# Altium footprint library 20210518.PcbLib: 414 footprints (part 14 of 26)
Each footprint in its own frame and in the unit in brackets; x right, y up, seen from the top. Pads: shape width x height; smd on the part's side, far side on the other; paste and mask are expansions set on the pad; w line width, h text height; cw(c..) or ccw(c..) is an arc to the next point about the centre after c.
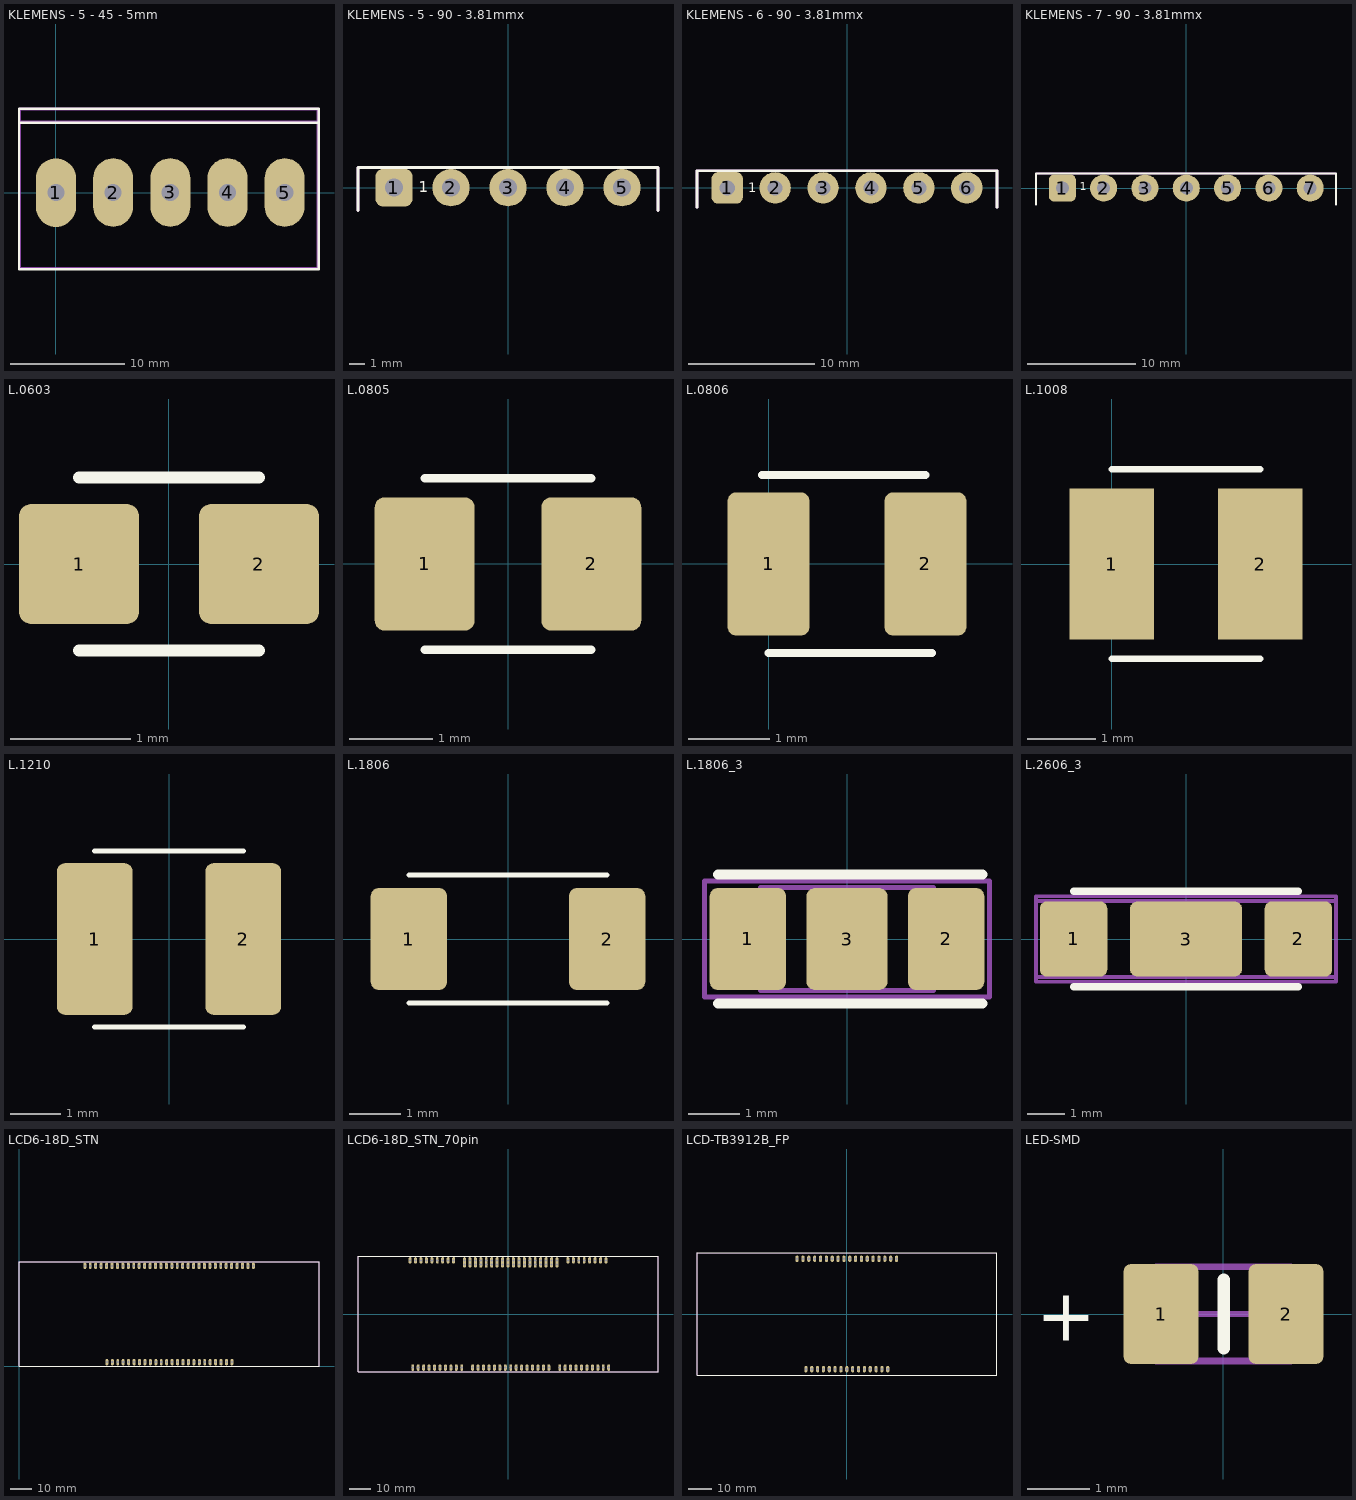
[diagram p13: the footprints below, top view; thin cyan lines are the x and y axes]

## KLEMENS - 5 - 45 - 5mm [mm] "45 Derece 5 Pin Yesil Konnektor"
pads (5):
  oval 3.5x5.999 hole 1.499: 1(0,0) 2(5,0.012) 3(10,0.015) 4(15,0.015) 5(20,0.012)
Top Overlay:
  lines w0.203: -3.231,-6.692 -3.231,7.329 22.978,7.329 22.978,-6.692 -3.231,-6.692
  lines w0.254: -3.069,6.11 22.966,6.11
Mechanical 13:
  lines w0.254: -3.196,7.303 -3.196,-6.641 22.9,-6.641 22.9,7.303 -3.17,7.303 ; -3.17,6.16 22.788,6.16
3D body: height 15.3, standoff -3.5, extent -3.27,-6.4 22.471,7

## KLEMENS - 5 - 90 - 3.81mmx [mm] "Connector; Header; 5 Position"
height 8.5
pads (5):
  rrect40% 2.5x2.5 hole 1.2: 1(-7.62,0)
  round 2.5 hole 1.2: 2(-3.81,0) 3(0,0) 4(3.81,0) 5(7.62,0)
Top Overlay:
  lines w0.2: -10.025,-1.524 -10.025,1.346 10.008,1.346 ; 10.025,-1.524 10.025,1.346
  text "1" at -5.969,-0.559 h1.27
Mechanical 13:
  lines w0.2: -10.025,-1.524 -10.025,1.346 ; -10.008,1.346 10.008,1.346 ; 10.025,-1.524 10.025,1.346
Mechanical 15:
  lines w0.2: -10.025,-1.524 -10.025,1.346 ; -10.008,1.346 10.008,1.346 ; 10.025,-1.524 10.025,1.346
3D body: height 7, standoff -3.5, extent -10.169,-9.454 10.271,1.346
3D body: height 7.6, standoff -3.5, extent -9.971,-18.999 9.869,-2.899

## KLEMENS - 6 - 90 - 3.81mmx [mm] "Connector; Header; 6 Position"
height 8.5
pads (6):
  rrect40% 2.5x2.5 hole 1.2: 1(-9.525,0)
  round 2.5 hole 1.2: 2(-5.715,0) 3(-1.905,0) 4(1.905,0) 5(5.715,0) 6(9.525,0)
Top Overlay:
  lines w0.2: -11.93,-1.524 -11.93,1.346 ; -11.913,1.346 11.913,1.346 ; 11.93,-1.524 11.93,1.346
  text "1" at -7.849,-0.61 h1.27
Mechanical 13:
  lines w0.2: -11.93,-1.524 -11.93,1.346 ; -11.913,1.346 11.913,1.346 ; 11.93,-1.524 11.93,1.346
Mechanical 15:
  lines w0.2: -11.93,-1.524 -11.93,1.346 ; -11.913,1.346 11.887,1.346 ; 11.93,-1.524 11.93,1.346
3D body: height 7, standoff -3.5, extent -12.1,-8.971 12.15,1.829

## KLEMENS - 7 - 90 - 3.81mmx [mm] "Connector; Header; 7 Position"
height 8.5
pads (7):
  rrect40% 2.5x2.5 hole 1.2: 1(-11.43,0)
  round 2.5 hole 1.2: 2(-7.62,0) 3(-3.81,0) 4(0,0) 5(3.81,0) 6(7.62,0) 7(11.43,0)
Top Overlay:
  lines w0.2: -13.86,-1.524 -13.86,1.346 ; -13.843,1.346 13.792,1.346 ; 13.81,-1.524 13.81,1.346
  text "1" at -9.804,-0.483 h1.27
Mechanical 13:
  lines w0.2: -13.86,-1.524 -13.86,1.346 ; -13.843,1.346 13.792,1.346 ; 13.81,-1.524 13.81,1.346
Mechanical 15:
  lines w0.2: -13.86,-1.524 -13.86,1.346 ; -13.843,1.346 13.792,1.346 13.81,1.328 13.81,-1.524
3D body: height 7, standoff -3.5, extent -14.03,-8.971 14.03,1.829

## L.0603 [mm] "Ferrite Bead, Body 1.6x0.8mm, IPC High Density"
height 0.9
pads (2):
  rrect20% 1x1 smd: 1(-0.75,0) 2(0.75,0)
Top Overlay:
  lines w0.1: -0.75,-0.72 0.75,-0.72 ; -0.75,0.72 0.75,0.72
3D body: height 0.9, standoff 0, extent -0.85,-0.475 0.85,0.475

## L.0805 [mm] "Ferrite Bead, Body 2.0x1.3mm, IPC High Density"
height 0.9
pads (2):
  rrect20% 1.2x1.6 smd: 1(-1,0) 2(1,0)
Top Overlay:
  lines w0.1: -1,-1.03 1,-1.03 ; -1,1.03 1,1.03
3D body: height 1.25, standoff 0, extent -1,-0.626 1,0.626

## L.0806 [mm] "2x1.6x1mm"
height 1
pads (2):
  rrect20% 1x1.75 smd: 1(0,0) 2(1.92,0)
Top Overlay:
  lines w0.1: -0.08,1.09 1.92,1.09 ; 0,-1.09 2,-1.09
3D body: height 0.95, standoff 0, extent -0.08,-0.6 1.92,0.6

## L.1008 [mm]
pads (2):
  rect 1.24x2.22 smd: 1(0,0) 2(2.18,0)
Top Overlay:
  lines w0.1: 0,-1.39 2.18,-1.39 ; 0,1.39 2.18,1.39
3D body: height 1.8, standoff 0, extent -0.16,-1 2.34,1

## L.1210 [mm] "Chip Inductor, 2-Leads, Body 3,20x2,50mm, IPC Medium Density"
height 1.2
pads (2):
  rrect20% 1.5x3 smd: 1(-1.47,0) 2(1.47,0)
Top Overlay:
  lines w0.1: -1.47,-1.74 1.47,-1.74 ; -1.47,1.74 1.47,1.74
3D body: height 1.35, standoff 0.05, extent -1.6,-1.6 1.6,1.6

## L.1806 [mm] "Ferrite Bead, Body 4.5x1.6mm, IPC High Density"
height 1.6
pads (2):
  rrect20% 1.5x2 smd: 1(-1.95,0) 2(1.95,0)
Top Overlay:
  lines w0.1: -1.95,-1.26 1.95,-1.26 ; -1.95,1.26 1.95,1.26
3D body: height 1.6, standoff 0, extent -1.7,-1.016 1.7,1.016

## L.1806_3 [mm] "Ferrite Bead, Body 4.5x1.6mm, 3 pin, IPC High Density"
height 1.6
pads (3):
  rrect20% 1.5x2 smd: 1(-1.95,0) 2(1.95,0)
  rrect20% 1.6x2 smd: 3(0,0)
Top Overlay:
  lines w0.2: -2.54,-1.27 2.667,-1.27 ; -2.54,1.27 2.667,1.27
Mechanical 13:
  lines w0.1: -1.7,-1.016 1.7,-1.016 1.7,1.016 -1.7,1.016 -1.7,-1.016
Mechanical 15:
  lines w0.1: -0.5,0 0.5,0 ; 0,-0.5 0,0.5 ; -2.8,-1.143 2.8,-1.143 2.8,1.143 -2.8,1.143 -2.8,-1.143
3D body: height 1.6, standoff 0, extent -1.7,-1.016 1.7,1.016

## L.2606_3 [mm] "Ferrite Bead, Body 6.8x1.6mm, 3 pin, IPC High Density"
height 1.6
pads (3):
  rrect20% 1.8x2 smd: 1(-3,0) 2(3,0)
  rrect20% 3x2 smd: 3(0,0)
Top Overlay:
  lines w0.2: -3,-1.27 3,-1.27 ; -3,1.27 3,1.27
Mechanical 13:
  lines w0.1: -4,-1.016 4,-1.016 4,1.016 -4,1.016 -4,-1.016
Mechanical 15:
  lines w0.1: -0.5,0 0.5,0 ; 0,-0.5 0,0.5 ; -4,-1.143 4,-1.143 4,1.143 -4,1.143 -4,-1.143
3D body: height 1.6, standoff 0, extent -3.4,-0.8 3.4,0.8

## LCD6-18D_STN [mm] "Pazarcý için yapýlan LCD"
pads (56):
  oval 1.37x3 hole 1: 1(30.6,46.9) 2(33.14,46.9) 3(35.68,46.9) 4(38.22,46.9) 5(40.76,46.9) 6(43.3,46.9) 7(45.84,46.9) 8(48.38,46.9) 9(50.92,46.9) 10(53.46,46.9) 11(56,46.9) 12(58.54,46.9) 13(61.08,46.9) 14(63.62,46.9) 15(66.16,46.9) 16(68.7,46.9) 17(71.24,46.9) 18(73.78,46.9) 19(76.32,46.9) 20(78.86,46.9) 21(81.4,46.9) 22(83.94,46.9) 23(86.48,46.9) 24(89.02,46.9) 25(91.56,46.9) 26(94.1,46.9) 27(96.64,46.9) 28(99.18,46.9) 29(101.72,46.9) 30(104.26,46.9) 31(106.8,46.9) 32(109.34,46.9) 33(99.32,1.9) 34(96.78,1.9) 35(94.24,1.9) 36(91.7,1.9) 37(89.16,1.9) 38(86.62,1.9) 39(84.08,1.9) 40(81.54,1.9) 41(79,1.9) 42(76.46,1.9) 43(73.92,1.9) 44(71.38,1.9) 45(68.84,1.9) 46(66.3,1.9) 47(63.76,1.9) 48(61.22,1.9) 49(58.68,1.9) 50(56.14,1.9) 51(53.6,1.9) 52(51.06,1.9) 53(48.52,1.9) 54(45.98,1.9) 55(43.44,1.9) 56(40.9,1.9)
Top Overlay:
  lines w0.254: 0,0 0,48.8 140,48.8 140,0 0,0
Mechanical 13:
  lines w0.254: 0,0 0,48.8 140,48.8 140,0 0,0
Mechanical 15:
  lines w0.254: -0.15,48.795 139.85,48.795 ; 0,40.8 0,0 140,0 140,40.8
3D body: height 9, standoff 6.5, extent -0.07,-0.081 139.94,48.77

## LCD6-18D_STN_70pin [mm] "LCD18D_70pin"
pads (88):
  oval 1.37x3 hole 1: 1(-45.71,25.03) 2(-43.17,25.03) 3(-40.63,25.03) 4(-38.09,25.03) 5(-35.55,25.03) 6(-33.01,25.03) 7(-30.47,25.03) 8(-27.93,25.03) 9(-25.39,25.03) 10(-20.31,23.11) 11(-17.77,23.12) 12(-15.23,23.12) 13(-12.69,23.12) 14(-10.15,23.12) 15(-7.61,23.12) 16(-5.07,23.12) 17(-2.53,23.12) 18(0.01,23.12) 19(2.55,23.12) 20(5.09,23.12) 21(7.63,23.12) 22(10.17,23.12) 23(12.71,23.12) 24(15.25,23.12) 25(17.79,23.12) 26(20.33,23.12) 27(22.87,23.11) 28(27.95,25.03) 29(30.49,25.03) 30(33.03,25.03) 31(35.57,25.03) 32(38.11,25.03) 33(40.65,25.03) 34(43.19,25.03) 35(45.73,25.03) 36(-44.44,-25.01) 37(-41.9,-25.01) 38(-39.36,-25.01) 39(-36.82,-25.01) 40(-34.28,-25.01) 41(-31.74,-25.01) 42(-29.2,-25.01) 43(-26.66,-25.01) 44(-24.12,-25.01) 45(-21.58,-25.01) 46(-16.5,-25.01) 47(-13.96,-25.01) 48(-11.42,-25.01) 49(-8.88,-25.01) 50(-6.34,-25.01) 51(-3.8,-25.01) 52(-1.26,-25.01) 53(1.28,-25.01) 54(3.82,-25.01) 55(6.36,-25.01) 56(8.9,-25.01) 57(11.44,-25.01) 58(13.98,-25.01) 59(16.52,-25.01) 60(19.06,-25.01) 61(24.14,-25.01) 62(26.68,-25.01) 63(29.22,-25.01) 64(31.76,-25.01) 65(34.3,-25.01) 66(36.84,-25.01) 67(39.38,-25.01) 68(41.92,-25.01) 69(44.46,-25.01) 70(47,-25.01) 71(-20.31,25.03) 72(-17.77,25.03) 73(-15.23,25.03) 74(-12.69,25.03) 75(-10.15,25.03) 76(-7.61,25.03) 77(-5.07,25.03) 78(-2.53,25.03) 79(0.01,25.03) 80(2.55,25.03) 81(5.09,25.03) 82(7.63,25.03) 83(10.17,25.03) 84(12.71,25.03) 85(15.25,25.03) 86(17.79,25.03) 87(20.33,25.03) 88(22.87,25.03)
Top Overlay:
  lines w0.254: -70,-27 -70,27 70,27 70,-27 -70,-27
Mechanical 13:
  lines w0.254: -70,-27 -70,27 70,27 70,-27 -70,-27
Mechanical 15:
  lines w0.254: -70,-27 70,-27 70,27 -70,27 -70,-27
3D body: height 9, standoff 6.5, extent -70.125,-27.125 70.125,27.125

## LCD-TB3912B_FP [mil] "33 pin (2x31) , 6 digit , custom LCD"
height 374.02
pads (33):
  oval 53.93x109.83 hole 38: 1(-849.1,944.5) 2(-749.1,944.5) 3(-649.1,944.5) 4(-549.1,944.5) 5(-449.1,944.5) 6(-349.1,944.5) 7(-249.1,944.5) 8(-149.1,944.5) 9(-49.1,944.5) 10(50.9,944.5) 11(150.9,944.5) 12(250.9,944.5) 13(350.9,944.5) 14(450.9,944.5) 15(550.9,944.5) 16(650.9,944.5) 17(750.9,944.5) 18(850.9,944.5) 19(-699.1,-943) 20(-599.1,-943) 21(-499.1,-943) 22(-399.1,-943) 23(-299.1,-943) 24(-199.1,-943) 25(-99.1,-943) 26(0.9,-943) 27(100.9,-943) 28(200.9,-943) 29(300.9,-943) 30(400.9,-943) 31(500.9,-943) 32(600.9,-943) 33(700.9,-943)
Top Overlay:
  lines w19.68: -2561.6,-1043 -2561.6,1043.63 2569.43,1043.63 2569.43,-1043 -2561.6,-1043
Mechanical 15:
  lines w19.68: -2561.6,-1043 -2561.6,1043.63 2569.43,1041.67 2569.43,-1043 -2561.6,-1043
3D body: height 354.33, standoff 255.91, extent -2562.99,-944.88 2570.87,944.88

## LED-SMD [mm] "0805 Kýlýf SMD Led"
pads (2):
  rrect20% 1.2x1.6 smd: 1(-1,0) 2(1,0)
Top Overlay:
  lines w0.2: 0,-0.55 0,0.55
  text "+" at -3,-0.7 h1.43
Mechanical 13:
  lines w0.1: -1.075,-0.762 -1.075,0.762 1.075,0.762 1.075,-0.762 -1.075,-0.762
Mechanical 15:
  lines w0.1: -0.5,0 0.5,0 ; 0,-0.5 0,0.5 ; -1.4,-0.75 -1.4,0.75 1.4,0.75 1.4,-0.75 -1.4,-0.75
3D body: height 0.85, standoff 0.01, extent -1.059,-0.46 1.003,0.446